# Altium footprint library PcbLib_ICs.PcbLib: 317 footprints (part 16 of 24)
Each footprint in its own frame and in the unit in brackets; x right, y up, seen from the top. Pads: shape width x height; smd on the part's side, far side on the other; paste and mask are expansions set on the pad; w line width, h text height; cw(c..) or ccw(c..) is an arc to the next point about the centre after c.
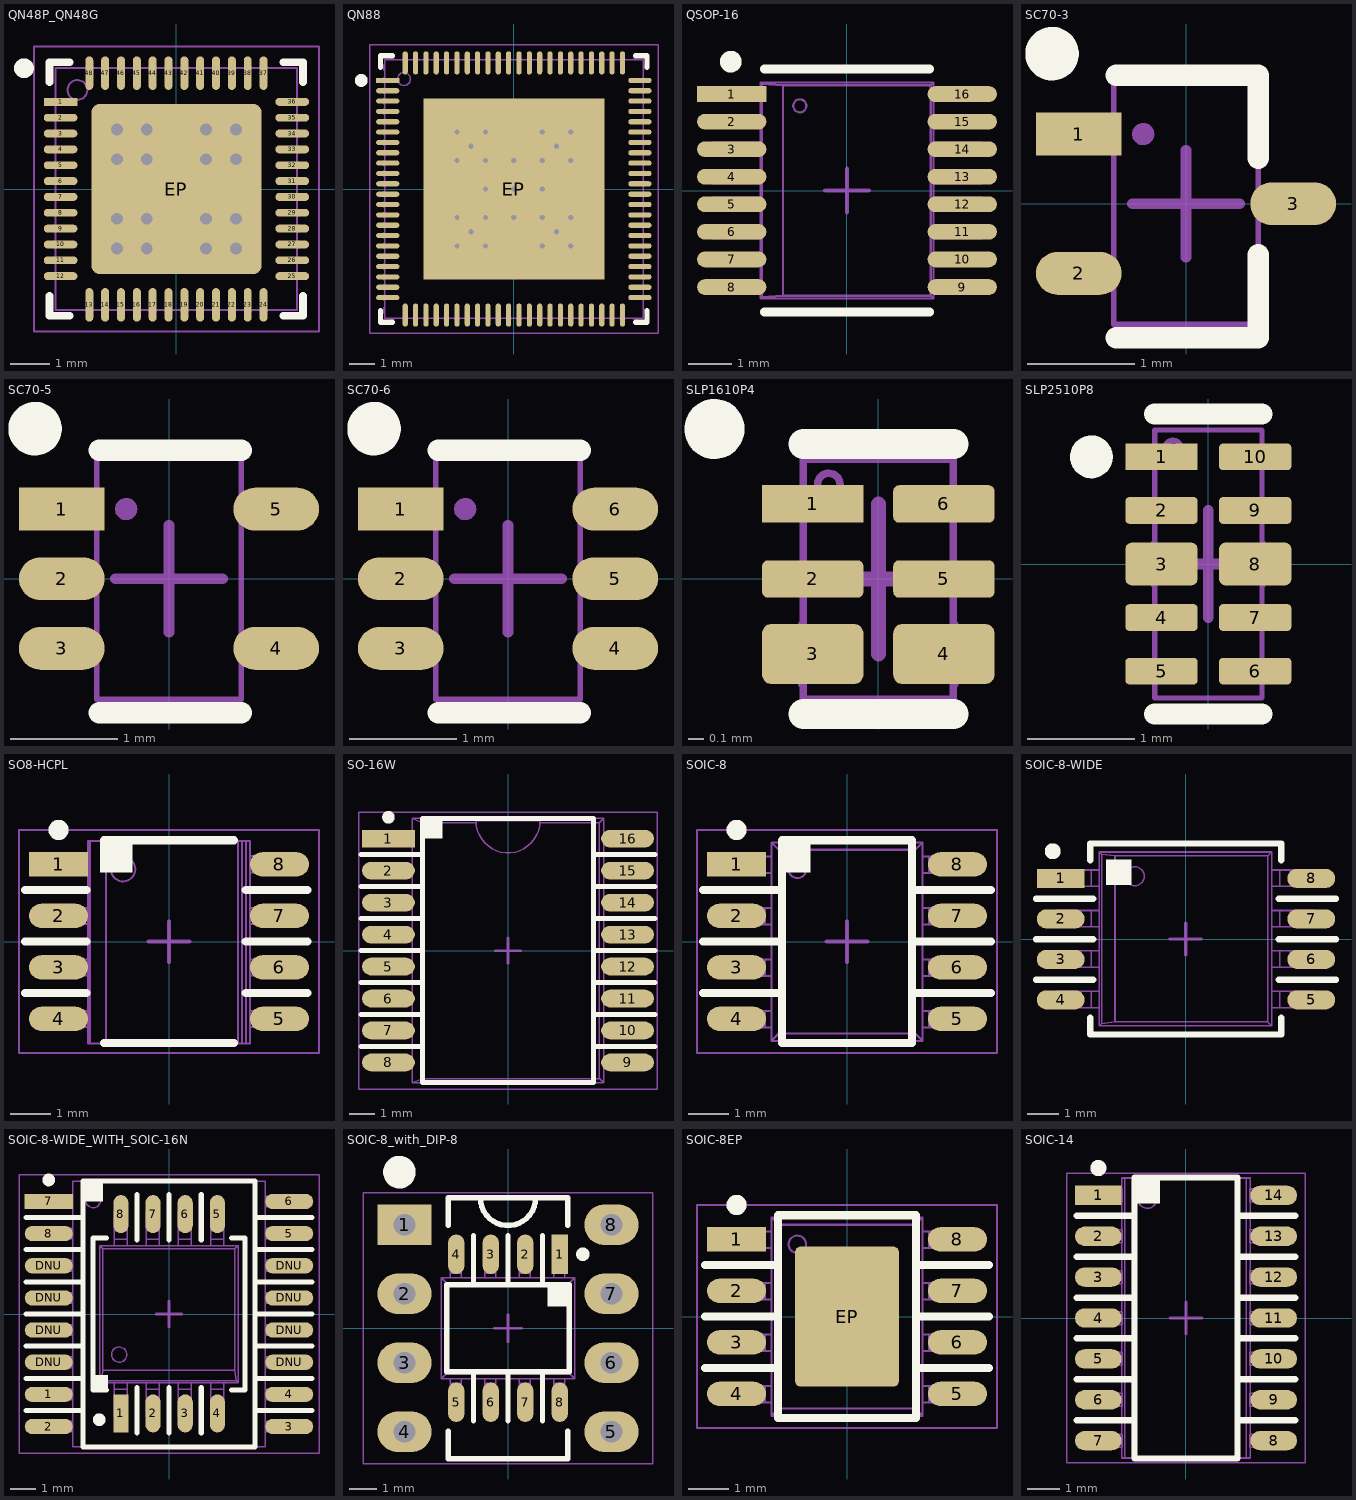
[diagram p15: the footprints below, top view; thin cyan lines are the x and y axes]

## QN48P_QN48G [mm] "QFN48 package 6x6 mm with 0.4mm pitch"
height 1
pads (49):
  rect 0.85x0.2 smd paste+0 mask+0.05: 1(-2.925,2.2)
  oval 0.85x0.2 smd paste+0 mask+0.05: 2(-2.925,1.8) 3(-2.925,1.4) 4(-2.925,1) 5(-2.925,0.6) 6(-2.925,0.2) 7(-2.925,-0.2) 8(-2.925,-0.6) 9(-2.925,-1) 10(-2.925,-1.4) 11(-2.925,-1.8) 12(-2.925,-2.2) 25(2.925,-2.2) 26(2.925,-1.8) 27(2.925,-1.4) 28(2.925,-1) 29(2.925,-0.6) 30(2.925,-0.2) 31(2.925,0.2) 32(2.925,0.6) 33(2.925,1) 34(2.925,1.4) 35(2.925,1.8) 36(2.925,2.2)
  oval 0.2x0.85 smd paste+0 mask+0.05: 13(-2.2,-2.925) 14(-1.8,-2.925) 15(-1.4,-2.925) 16(-1,-2.925) 17(-0.6,-2.925) 18(-0.2,-2.925) 19(0.2,-2.925) 20(0.6,-2.925) 21(1,-2.925) 22(1.4,-2.925) 23(1.8,-2.925) 24(2.2,-2.925) 37(2.2,2.925) 38(1.8,2.925) 39(1.4,2.925) 40(1,2.925) 41(0.6,2.925) 42(0.2,2.925) 43(-0.2,2.925) 44(-0.6,2.925) 45(-1,2.925) 46(-1.4,2.925) 47(-1.8,2.925) 48(-2.2,2.925)
  rrect10% 4.3x4.3 smd paste-50 mask+0.05: EP(0,0)
via -1.5,-0.75 diameter 0.7 hole 0.3
via -0.75,-0.75 diameter 0.7 hole 0.3
via -0.75,-1.5 diameter 0.7 hole 0.3
via -1.5,-1.5 diameter 0.7 hole 0.3
via 1.5,-0.75 diameter 0.7 hole 0.3
via 0.75,-0.75 diameter 0.7 hole 0.3
via 0.75,-1.5 diameter 0.7 hole 0.3
via 1.5,-1.5 diameter 0.7 hole 0.3
via 1.5,0.75 diameter 0.7 hole 0.3
via 0.75,0.75 diameter 0.7 hole 0.3
via 0.75,1.5 diameter 0.7 hole 0.3
via 1.5,1.5 diameter 0.7 hole 0.3
via -1.5,0.75 diameter 0.7 hole 0.3
via -0.75,0.75 diameter 0.7 hole 0.3
via -0.75,1.5 diameter 0.7 hole 0.3
via -1.5,1.5 diameter 0.7 hole 0.3
Top Overlay:
  circle w0.25: c-3.85,3.05 r0.125
  lines w0.2: -3.2,-2.7 -3.2,-3.2 -2.7,-3.2 ; -3.2,2.7 -3.2,3.2 -2.7,3.2 ; 2.7,-3.2 3.2,-3.2 3.2,-2.7 ; 2.7,3.2 3.2,3.2 3.2,2.7
Top Paste:
  region: 1.5,2 1.5,1.5 2,1.5 2,2
  region: 0.8,2 0.8,1.5 1.3,1.5 1.3,2
  region: 0.1,2 0.1,1.5 0.6,1.5 0.6,2
  region: -0.6,2 -0.6,1.5 -0.1,1.5 -0.1,2
  region: -1.3,2 -1.3,1.5 -0.8,1.5 -0.8,2
  region: -2,2 -2,1.5 -1.5,1.5 -1.5,2
  region: 1.5,1.3 1.5,0.8 2,0.8 2,1.3
  region: 0.8,1.3 0.8,0.8 1.3,0.8 1.3,1.3
  region: 0.1,1.3 0.1,0.8 0.6,0.8 0.6,1.3
  region: -0.6,1.3 -0.6,0.8 -0.1,0.8 -0.1,1.3
  region: -1.3,1.3 -1.3,0.8 -0.8,0.8 -0.8,1.3
  region: -2,1.3 -2,0.8 -1.5,0.8 -1.5,1.3
  region: -1.5,-2 -1.5,-1.5 -2,-1.5 -2,-2
  region: -0.8,-2 -0.8,-1.5 -1.3,-1.5 -1.3,-2
  region: -0.1,-2 -0.1,-1.5 -0.6,-1.5 -0.6,-2
  region: 0.6,-2 0.6,-1.5 0.1,-1.5 0.1,-2
  region: 1.3,-2 1.3,-1.5 0.8,-1.5 0.8,-2
  region: 2,-2 2,-1.5 1.5,-1.5 1.5,-2
  region: -1.5,-1.3 -1.5,-0.8 -2,-0.8 -2,-1.3
  region: -0.8,-1.3 -0.8,-0.8 -1.3,-0.8 -1.3,-1.3
  region: -0.1,-1.3 -0.1,-0.8 -0.6,-0.8 -0.6,-1.3
  region: 0.6,-1.3 0.6,-0.8 0.1,-0.8 0.1,-1.3
  region: 1.3,-1.3 1.3,-0.8 0.8,-0.8 0.8,-1.3
  region: 2,-1.3 2,-0.8 1.5,-0.8 1.5,-1.3
  region: 1.5,0.6 1.5,0.1 2,0.1 2,0.6
  region: 0.8,0.6 0.8,0.1 1.3,0.1 1.3,0.6
  region: 0.1,0.6 0.1,0.1 0.6,0.1 0.6,0.6
  region: -0.6,0.6 -0.6,0.1 -0.1,0.1 -0.1,0.6
  region: -1.3,0.6 -1.3,0.1 -0.8,0.1 -0.8,0.6
  region: -2,0.6 -2,0.1 -1.5,0.1 -1.5,0.6
  region: -1.5,-0.6 -1.5,-0.1 -2,-0.1 -2,-0.6
  region: -0.8,-0.6 -0.8,-0.1 -1.3,-0.1 -1.3,-0.6
  region: -0.1,-0.6 -0.1,-0.1 -0.6,-0.1 -0.6,-0.6
  region: 0.6,-0.6 0.6,-0.1 0.1,-0.1 0.1,-0.6
  region: 1.3,-0.6 1.3,-0.1 0.8,-0.1 0.8,-0.6
  region: 2,-0.6 2,-0.1 1.5,-0.1 1.5,-0.6
Bottom Solder:
  region: -2.2,2.2 -0.4,2.2 0,1.8 0.4,2.2 2.2,2.2 2.2,0.4 1.8,0 2.2,-0.4 2.2,-2.2 0.4,-2.2 0,-1.8 -0.4,-2.2 -2.2,-2.2 -2.2,-0.4 -1.8,0 -2.2,0.4
Top Assy:
  circle w0.05: c-2.5,2.5 r0.25
  lines w0.05: -3.062,-2.275 -3.095,-2.275 -3.095,-2.125 -3.062,-2.125 ; -3.062,-1.875 -3.095,-1.875 -3.095,-1.725 -3.062,-1.725 ; -3.062,-1.475 -3.095,-1.475 -3.095,-1.325 -3.062,-1.325 ; -3.062,-1.075 -3.095,-1.075 -3.095,-0.925 -3.062,-0.925 ; -3.062,-0.675 -3.095,-0.675 -3.095,-0.525 -3.062,-0.525 ; -3.062,-0.275 -3.095,-0.275 -3.095,-0.125 -3.062,-0.125 ; -3.062,0.125 -3.095,0.125 -3.095,0.275 -3.062,0.275 ; -3.062,0.525 -3.095,0.525 -3.095,0.675 -3.062,0.675 ; -3.062,0.925 -3.095,0.925 -3.095,1.075 -3.062,1.075 ; -3.062,1.325 -3.095,1.325 -3.095,1.475 -3.062,1.475 ; -3.062,1.725 -3.095,1.725 -3.095,1.875 -3.062,1.875 ; -3.062,2.125 -3.095,2.125 -3.095,2.275 -3.062,2.275 ; -2.275,-3.062 -2.275,-3.095 -2.125,-3.095 -2.125,-3.062 ; -2.275,3.062 -2.275,3.095 -2.125,3.095 -2.125,3.062 ; -1.875,-3.062 -1.875,-3.095 -1.725,-3.095 -1.725,-3.062 ; -1.875,3.062 -1.875,3.095 -1.725,3.095 -1.725,3.062 ; -1.475,-3.062 -1.475,-3.095 -1.325,-3.095 -1.325,-3.062 ; -1.475,3.062 -1.475,3.095 -1.325,3.095 -1.325,3.062 ; -1.075,-3.062 -1.075,-3.095 -0.925,-3.095 -0.925,-3.062 ; -1.075,3.062 -1.075,3.095 -0.925,3.095 -0.925,3.062 ; -0.675,-3.062 -0.675,-3.095 -0.525,-3.095 -0.525,-3.062 ; -0.675,3.062 -0.675,3.095 -0.525,3.095 -0.525,3.062 ; -0.275,-3.062 -0.275,-3.095 -0.125,-3.095 -0.125,-3.062 ; -0.275,3.062 -0.275,3.095 -0.125,3.095 -0.125,3.062 ; 0.125,-3.062 0.125,-3.095 0.275,-3.095 0.275,-3.062 ; 0.125,3.062 0.125,3.095 0.275,3.095 0.275,3.062 ; 0.525,-3.062 0.525,-3.095 0.675,-3.095 0.675,-3.062 ; 0.525,3.062 0.525,3.095 0.675,3.095 0.675,3.062 ; 0.925,-3.062 0.925,-3.095 1.075,-3.095 1.075,-3.062 ; 0.925,3.062 0.925,3.095 1.075,3.095 1.075,3.062 ; 1.325,-3.062 1.325,-3.095 1.475,-3.095 1.475,-3.062 ; 1.325,3.062 1.325,3.095 1.475,3.095 1.475,3.062 ; 1.725,-3.062 1.725,-3.095 1.875,-3.095 1.875,-3.062 ; 1.725,3.062 1.725,3.095 1.875,3.095 1.875,3.062 ; 2.125,-3.062 2.125,-3.095 2.275,-3.095 2.275,-3.062 ; 2.125,3.062 2.125,3.095 2.275,3.095 2.275,3.062 ; 3.062,-2.275 3.095,-2.275 3.095,-2.125 3.062,-2.125 ; 3.062,-1.875 3.095,-1.875 3.095,-1.725 3.062,-1.725 ; 3.062,-1.475 3.095,-1.475 3.095,-1.325 3.062,-1.325 ; 3.062,-1.075 3.095,-1.075 3.095,-0.925 3.062,-0.925 ; 3.062,-0.675 3.095,-0.675 3.095,-0.525 3.062,-0.525 ; 3.062,-0.275 3.095,-0.275 3.095,-0.125 3.062,-0.125 ; 3.062,0.125 3.095,0.125 3.095,0.275 3.062,0.275 ; 3.062,0.525 3.095,0.525 3.095,0.675 3.062,0.675 ; 3.062,0.925 3.095,0.925 3.095,1.075 3.062,1.075 ; 3.062,1.325 3.095,1.325 3.095,1.475 3.062,1.475 ; 3.062,1.725 3.095,1.725 3.095,1.875 3.062,1.875 ; 3.062,2.125 3.095,2.125 3.095,2.275 3.062,2.275 ; -3.05,-3.05 -3.05,3.05 3.05,3.05 3.05,-3.05 -3.05,-3.05
  text ".Designator" at -3.443,-0.467 h2
Top Text:
  lines w0.05: -3.6,-3.6 -3.6,3.6 3.6,3.6 3.6,-3.6 -3.6,-3.6
  lines w0.1: -0.5,0 0.5,0 ; 0,-0.5 0,0.5
3D body "GOWIN_QN48P_QN48G.STEP": height 0.85, standoff 0, extent -3.025,-3.025 3.025,3.025

## QN88 [mm] "QFN, 88-Leads, Body 10.00x10.00mm, Pitch 0.40mm, Thermal Pad 7x7mm, IPC Medium Density"
height 0.75
pads (89):
  rect 0.9x0.2 smd mask+0.05: 1(-4.875,4.2)
  oval 0.9x0.2 smd mask+0.05: 2(-4.875,3.8) 3(-4.875,3.4) 4(-4.875,3) 5(-4.875,2.6) 6(-4.875,2.2) 7(-4.875,1.8) 8(-4.875,1.4) 9(-4.875,1) 10(-4.875,0.6) 11(-4.875,0.2) 12(-4.875,-0.2) 13(-4.875,-0.6) 14(-4.875,-1) 15(-4.875,-1.4) 16(-4.875,-1.8) 17(-4.875,-2.2) 18(-4.875,-2.6) 19(-4.875,-3) 20(-4.875,-3.4) 21(-4.875,-3.8) 22(-4.875,-4.2) 45(4.875,-4.2) 46(4.875,-3.8) 47(4.875,-3.4) 48(4.875,-3) 49(4.875,-2.6) 50(4.875,-2.2) 51(4.875,-1.8) 52(4.875,-1.4) 53(4.875,-1) 54(4.875,-0.6) 55(4.875,-0.2) 56(4.875,0.2) 57(4.875,0.6) 58(4.875,1) 59(4.875,1.4) 60(4.875,1.8) 61(4.875,2.2) 62(4.875,2.6) 63(4.875,3) 64(4.875,3.4) 65(4.875,3.8) 66(4.875,4.2)
  oval 0.2x0.9 smd mask+0.05: 23(-4.2,-4.875) 24(-3.8,-4.875) 25(-3.4,-4.875) 26(-3,-4.875) 27(-2.6,-4.875) 28(-2.2,-4.875) 29(-1.8,-4.875) 30(-1.4,-4.875) 31(-1,-4.875) 32(-0.6,-4.875) 33(-0.2,-4.875) 34(0.2,-4.875) 35(0.6,-4.875) 36(1,-4.875) 37(1.4,-4.875) 38(1.8,-4.875) 39(2.2,-4.875) 40(2.6,-4.875) 41(3,-4.875) 42(3.4,-4.875) 43(3.8,-4.875) 44(4.2,-4.875) 67(4.2,4.875) 68(3.8,4.875) 69(3.4,4.875) 70(3,4.875) 71(2.6,4.875) 72(2.2,4.875) 73(1.8,4.875) 74(1.4,4.875) 75(1,4.875) 76(0.6,4.875) 77(0.2,4.875) 78(-0.2,4.875) 79(-0.6,4.875) 80(-1,4.875) 81(-1.4,4.875) 82(-1.8,4.875) 83(-2.2,4.875) 84(-2.6,4.875) 85(-3,4.875) 86(-3.4,4.875) 87(-3.8,4.875) 88(-4.2,4.875)
  rect 7x7 smd paste-3 mask+0.05: EP(0,0)
via -2.2,-2.2 diameter 0.5 hole 0.2
via -2.2,-1.1 diameter 0.5 hole 0.2
via -2.2,1.1 diameter 0.5 hole 0.2
via -2.2,2.2 diameter 0.5 hole 0.2
via -1.1,-2.2 diameter 0.5 hole 0.2
via -1.1,-1.1 diameter 0.5 hole 0.2
via -1.1,0 diameter 0.5 hole 0.2
via -1.1,1.1 diameter 0.5 hole 0.2
via -1.1,2.2 diameter 0.5 hole 0.2
via 0,-1.1 diameter 0.5 hole 0.2
via 0,0 diameter 0.5 hole 0.2
via 0,1.1 diameter 0.5 hole 0.2
via 1.1,-2.2 diameter 0.5 hole 0.2
via 1.1,-1.1 diameter 0.5 hole 0.2
via 1.1,0 diameter 0.5 hole 0.2
via 1.1,1.1 diameter 0.5 hole 0.2
via 1.1,2.2 diameter 0.5 hole 0.2
via 2.2,-2.2 diameter 0.5 hole 0.2
via 2.2,-1.1 diameter 0.5 hole 0.2
via 2.2,1.1 diameter 0.5 hole 0.2
via 2.2,2.2 diameter 0.5 hole 0.2
via 1.65,1.65 diameter 0.5 hole 0.2
via 1.65,-1.65 diameter 0.5 hole 0.2
via -1.65,1.65 diameter 0.5 hole 0.2
via -1.65,-1.65 diameter 0.5 hole 0.2
Top Overlay:
  circle w0.25: c-5.9,4.2 r0.125
  lines w0.2: -5.15,-4.7 -5.15,-5.15 -4.7,-5.15 ; -5.15,4.7 -5.15,5.15 -4.7,5.15 ; 4.7,-5.15 5.15,-5.15 5.15,-4.7 ; 4.7,5.15 5.15,5.15 5.15,4.7
Top Paste:
  region: 0.6,0.6 0.1,0.6 0.1,0.1 0.6,0.1
  region: 0.6,-0.1 0.1,-0.1 0.1,-0.6 0.6,-0.6
  rectangle: -0.6,-0.6 -0.1,-0.1
  rectangle: -0.6,0.1 -0.1,0.6
  region: 0.6,-0.8 0.1,-0.8 0.1,-1.3 0.6,-1.3
  region: 0.6,-1.5 0.1,-1.5 0.1,-2 0.6,-2
  rectangle: -0.6,-2 -0.1,-1.5
  rectangle: -0.6,-1.3 -0.1,-0.8
  region: 0.6,2 0.1,2 0.1,1.5 0.6,1.5
  region: 0.6,1.3 0.1,1.3 0.1,0.8 0.6,0.8
  rectangle: -0.6,0.8 -0.1,1.3
  rectangle: -0.6,1.5 -0.1,2
  region: -0.8,0.6 -1.3,0.6 -1.3,0.1 -0.8,0.1
  region: -0.8,-0.1 -1.3,-0.1 -1.3,-0.6 -0.8,-0.6
  rectangle: -2,-0.6 -1.5,-0.1
  rectangle: -2,0.1 -1.5,0.6
  region: -0.8,-0.8 -1.3,-0.8 -1.3,-1.3 -0.8,-1.3
  region: -0.8,-1.5 -1.3,-1.5 -1.3,-2 -0.8,-2
  rectangle: -2,-2 -1.5,-1.5
  rectangle: -2,-1.3 -1.5,-0.8
  region: -0.8,2 -1.3,2 -1.3,1.5 -0.8,1.5
  region: -0.8,1.3 -1.3,1.3 -1.3,0.8 -0.8,0.8
  rectangle: -2,0.8 -1.5,1.3
  rectangle: -2,1.5 -1.5,2
  region: 2,0.6 1.5,0.6 1.5,0.1 2,0.1
  region: 2,-0.1 1.5,-0.1 1.5,-0.6 2,-0.6
  rectangle: 0.8,-0.6 1.3,-0.1
  rectangle: 0.8,0.1 1.3,0.6
  region: 2,-0.8 1.5,-0.8 1.5,-1.3 2,-1.3
  region: 2,-1.5 1.5,-1.5 1.5,-2 2,-2
  rectangle: 0.8,-2 1.3,-1.5
  rectangle: 0.8,-1.3 1.3,-0.8
  region: 2,2 1.5,2 1.5,1.5 2,1.5
  region: 2,1.3 1.5,1.3 1.5,0.8 2,0.8
  rectangle: 0.8,0.8 1.3,1.3
  rectangle: 0.8,1.5 1.3,2
  region: 0.6,2.7 0.1,2.7 0.1,2.2 0.6,2.2
  rectangle: -0.6,2.2 -0.1,2.7
  region: -0.8,2.7 -1.3,2.7 -1.3,2.2 -0.8,2.2
  rectangle: -2,2.2 -1.5,2.7
  region: 2,2.7 1.5,2.7 1.5,2.2 2,2.2
  rectangle: 0.8,2.2 1.3,2.7
  rectangle: -0.6,-2.7 -0.1,-2.2
  region: 0.6,-2.2 0.1,-2.2 0.1,-2.7 0.6,-2.7
  rectangle: 0.8,-2.7 1.3,-2.2
  region: 2,-2.2 1.5,-2.2 1.5,-2.7 2,-2.7
  rectangle: -2,-2.7 -1.5,-2.2
  region: -0.8,-2.2 -1.3,-2.2 -1.3,-2.7 -0.8,-2.7
  rectangle: -2.7,-0.6 -2.2,-0.1
  rectangle: -2.7,0.1 -2.2,0.6
  rectangle: -2.7,-2 -2.2,-1.5
  rectangle: -2.7,-1.3 -2.2,-0.8
  rectangle: -2.7,0.8 -2.2,1.3
  rectangle: -2.7,1.5 -2.2,2
  rectangle: -2.7,2.2 -2.2,2.7
  rectangle: -2.7,-2.7 -2.2,-2.2
  region: 2.7,0.6 2.2,0.6 2.2,0.1 2.7,0.1
  region: 2.7,-0.1 2.2,-0.1 2.2,-0.6 2.7,-0.6
  region: 2.7,2 2.2,2 2.2,1.5 2.7,1.5
  region: 2.7,1.3 2.2,1.3 2.2,0.8 2.7,0.8
  region: 2.7,-0.8 2.2,-0.8 2.2,-1.3 2.7,-1.3
  region: 2.7,-1.5 2.2,-1.5 2.2,-2 2.7,-2
  region: 2.7,-2.2 2.2,-2.2 2.2,-2.7 2.7,-2.7
  region: 2.7,2.7 2.2,2.7 2.2,2.2 2.7,2.2
Bottom Solder:
  region: -3,-3 -3,-0.6 -2.4,0 -3,0.6 -3,3 -0.6,3 0,2.4 0.601,3 3,3 3,0.6 2.4,0 3,-0.6 3,-3 0.6,-3 0,-2.4 -0.6,-3
Top Assy:
  drawing of 293 lines, arcs and shapes, not listed
  text ".Designator" at -3.443,-0.467 h2
Top Text:
  lines w0.05: -5.575,-5.575 -5.575,5.575 5.575,5.575 5.575,-5.575 -5.575,-5.575
  lines w0.1: -0.5,0 0.5,0 ; 0,-0.5 0,0.5
3D body "GOWIN_QN88.STEP": height 0.94, standoff -0.01, extent -5.05,-5.05 5.05,5.05

## QSOP-16 [mm]
height 1.75
pads (16):
  rect 1.6x0.36 smd paste+0 mask+0.08: 1(-2.655,2.222)
  oval 1.6x0.36 smd paste+0 mask+0.08: 2(-2.655,1.587) 3(-2.655,0.953) 4(-2.655,0.318) 5(-2.655,-0.318) 6(-2.655,-0.953) 7(-2.655,-1.587) 8(-2.655,-2.222) 9(2.655,-2.222) 10(2.655,-1.587) 11(2.655,-0.953) 12(2.655,-0.318) 13(2.655,0.318) 14(2.655,0.953) 15(2.655,1.587) 16(2.655,2.222)
Top Overlay:
  circle w0.25: c-2.677,2.967 r0.125
  lines w0.2: -1.9,-2.8 1.9,-2.8 ; -1.9,2.8 1.9,2.8
Top Assy:
  drawing of 256 lines, arcs and shapes, not listed
  text ".Designator" at 0.467,-3.443 h2
Top Text:
  lines w0.1: -0.5,0 0.5,0 ; 0,-0.5 0,0.5
3D body "User Library-QSOP16-1.step": height 1.75, standoff -0.01, extent -3.1,-2.49 3.1,2.49

## SC70-3 [mm]
pads (3):
  rect 0.8x0.4 smd paste+0 mask+0.05: 1(-1,0.65)
  oval 0.8x0.4 smd paste+0 mask+0.05: 2(-1,-0.65) 3(1,0)
Top Overlay:
  circle w0.25: c-1.25,1.4 r0.125
  lines w0.2: -0.65,-1.25 0.675,-1.25 0.675,-0.475 ; -0.65,1.2 0.675,1.2 0.675,0.425
Top Assy:
  circle w0.05: c-0.4,0.65 r0.079
  region: -0.479,0.65 -0.479,0.634 -0.467,0.605 -0.445,0.583 -0.416,0.571 -0.4,0.571 -0.384,0.571 -0.355,0.583 -0.333,0.605 -0.321,0.634 -0.321,0.65 -0.321,0.666 -0.333,0.695 -0.355,0.717 -0.384,0.729 -0.4,0.729 -0.416,0.729 -0.445,0.717 -0.467,0.695 -0.479,0.666
  lines w0.05: -1.1,-0.775 -1.1,-0.525 ; -1.1,0.525 -1.1,0.775 ; -0.8,-0.775 -0.8,-0.525 ; -0.8,0.525 -0.8,0.775 ; -0.675,-0.775 -1.3,-0.775 -1.3,-0.525 -0.675,-0.525 ; -0.675,0.525 -1.3,0.525 -1.3,0.775 -0.675,0.775 ; 0.675,-0.125 1.3,-0.125 1.3,0.125 0.675,0.125 ; 0.8,-0.125 0.8,0.125 ; 1.1,-0.125 1.1,0.125 ; -0.675,-1.125 0.675,-1.125 0.675,1.125 -0.675,1.125 -0.675,-1.125
  text ".Designator" at 0.233,-1.719 h1
Top Text:
  lines w0.1: -0.5,0 0.5,0 ; 0,-0.5 0,0.5
3D body "User Library-sc70-3.step": height 1, standoff 0, extent -1.125,-1.05 1.175,1.05

## SC70-5 [mm]
pads (5):
  rect 0.8x0.4 smd paste+0 mask+0.05: 1(-1,0.65)
  oval 0.8x0.4 smd paste+0 mask+0.05: 2(-1,0) 3(-1,-0.65) 4(1,-0.65) 5(1,0.65)
Top Overlay:
  circle w0.25: c-1.25,1.4 r0.125
  lines w0.2: -0.65,-1.25 0.675,-1.25 ; -0.65,1.2 0.675,1.2
Top Assy:
  circle w0.05: c-0.4,0.65 r0.079
  region: -0.479,0.65 -0.479,0.634 -0.467,0.605 -0.445,0.583 -0.416,0.571 -0.4,0.571 -0.384,0.571 -0.355,0.583 -0.333,0.605 -0.321,0.634 -0.321,0.65 -0.321,0.666 -0.333,0.695 -0.355,0.717 -0.384,0.729 -0.4,0.729 -0.416,0.729 -0.445,0.717 -0.467,0.695 -0.479,0.666
  lines w0.05: -1.1,-0.775 -1.1,-0.525 ; -1.1,-0.125 -1.1,0.125 ; -1.1,0.525 -1.1,0.775 ; -0.8,-0.775 -0.8,-0.525 ; -0.8,-0.125 -0.8,0.125 ; -0.8,0.525 -0.8,0.775 ; -0.675,-0.775 -1.3,-0.775 -1.3,-0.525 -0.675,-0.525 ; -0.675,-0.125 -1.3,-0.125 -1.3,0.125 -0.675,0.125 ; -0.675,0.525 -1.3,0.525 -1.3,0.775 -0.675,0.775 ; 0.675,-0.775 1.3,-0.775 1.3,-0.525 0.675,-0.525 ; 0.675,0.525 1.3,0.525 1.3,0.775 0.675,0.775 ; 0.8,-0.775 0.8,-0.525 ; 0.8,0.525 0.8,0.775 ; 1.1,-0.775 1.1,-0.525 ; 1.1,0.525 1.1,0.775 ; -0.675,-1.125 -0.675,1.125 0.675,1.125 0.675,-1.125 -0.675,-1.125
  text ".Designator" at 0.233,-1.719 h1
Top Text:
  lines w0.1: -0.5,0 0.5,0 ; 0,-0.5 0,0.5
3D body "sc70-5.step": height 1, standoff 0, extent -1.15,-1.05 1.15,1.05

## SC70-6 [mm]
pads (6):
  rect 0.8x0.4 smd paste+0 mask+0.05: 1(-1,0.65)
  oval 0.8x0.4 smd paste+0 mask+0.05: 2(-1,0) 3(-1,-0.65) 4(1,-0.65) 5(1,0) 6(1,0.65)
Top Overlay:
  circle w0.25: c-1.25,1.4 r0.125
  lines w0.2: -0.65,-1.25 0.675,-1.25 ; -0.65,1.2 0.675,1.2
Top Assy:
  circle w0.05: c-0.4,0.65 r0.079
  region: -0.479,0.65 -0.479,0.634 -0.467,0.605 -0.445,0.583 -0.416,0.571 -0.4,0.571 -0.384,0.571 -0.355,0.583 -0.333,0.605 -0.321,0.634 -0.321,0.65 -0.321,0.666 -0.333,0.695 -0.355,0.717 -0.384,0.729 -0.4,0.729 -0.416,0.729 -0.445,0.717 -0.467,0.695 -0.479,0.666
  lines w0.05: -1.1,-0.775 -1.1,-0.525 ; -1.1,-0.125 -1.1,0.125 ; -1.1,0.525 -1.1,0.775 ; -0.8,-0.775 -0.8,-0.525 ; -0.8,-0.125 -0.8,0.125 ; -0.8,0.525 -0.8,0.775 ; -0.675,-0.775 -1.3,-0.775 -1.3,-0.525 -0.675,-0.525 ; -0.675,-0.125 -1.3,-0.125 -1.3,0.125 -0.675,0.125 ; -0.675,0.525 -1.3,0.525 -1.3,0.775 -0.675,0.775 ; 0.675,-0.775 1.3,-0.775 1.3,-0.525 0.675,-0.525 ; 0.675,-0.125 1.3,-0.125 1.3,0.125 0.675,0.125 ; 0.675,0.525 1.3,0.525 1.3,0.775 0.675,0.775 ; 0.8,-0.775 0.8,-0.525 ; 0.8,-0.125 0.8,0.125 ; 0.8,0.525 0.8,0.775 ; 1.1,-0.775 1.1,-0.525 ; 1.1,-0.125 1.1,0.125 ; 1.1,0.525 1.1,0.775 ; -0.675,-1.125 0.675,-1.125 0.675,1.125 -0.675,1.125 -0.675,-1.125
  text ".Designator" at 0.233,-1.719 h1
Top Text:
  lines w0.1: -0.5,0 0.5,0 ; 0,-0.5 0,0.5
3D body "sc70-6.step": height 1.1, standoff 0, extent -1.2,-1.1 1.2,1.1

## SLP1610P4 [mm] "Package for RClamp0522P"
height 0.43
pads (6):
  rect 0.675x0.25 smd paste+0 mask+0.02: 1(-0.437,0.5)
  rrect30% 0.675x0.25 smd paste+0 mask+0.02: 2(-0.437,0) 5(0.437,0) 6(0.437,0.5)
  rrect30% 0.675x0.4 smd paste+0 mask+0.02: 3(-0.437,-0.5) 4(0.437,-0.5)
Top Overlay:
  circle w0.2: c-1.092,1 r0.1
  lines w0.2: -0.5,-0.9 0.5,-0.9 ; -0.5,0.9 0.5,0.9
Top Solder:
  region: -0.15,-0.28 0.15,-0.28 0.15,-0.72 -0.15,-0.72
Top Assy:
  circle w0.05: c-0.33,0.63 r0.075
  lines w0.05: -0.5,-0.7 -0.51,-0.7 -0.51,-0.3 -0.5,-0.3 ; -0.5,-0.1 -0.51,-0.1 -0.51,0.1 -0.5,0.1 ; -0.5,0.4 -0.51,0.4 -0.51,0.6 -0.5,0.6 ; 0.5,-0.7 0.51,-0.7 0.51,-0.3 0.5,-0.3 ; 0.5,-0.1 0.51,-0.1 0.51,0.1 0.5,0.1 ; 0.5,0.4 0.51,0.4 0.51,0.6 0.5,0.6 ; -0.5,-0.8 -0.5,0.8 0.5,0.8 0.5,-0.8 -0.5,-0.8
  text ".Designator" at 0.233,-1.719 h1
Top Text:
  lines w0.1: -0.5,0 0.5,0 ; 0,-0.5 0,0.5
3D body "RClamp0522P.STEP": height 0.6, standoff 0.02, extent -0.51,-0.8 0.51,0.8
